# Altium footprint library PowerProducts.PCBLIB: 166 footprints (part 11 of 11)
Each footprint in its own frame and in the unit in brackets; x right, y up, seen from the top. Pads: shape width x height; smd on the part's side, far side on the other; paste and mask are expansions set on the pad; w line width, h text height; cw(c..) or ccw(c..) is an arc to the next point about the centre after c.
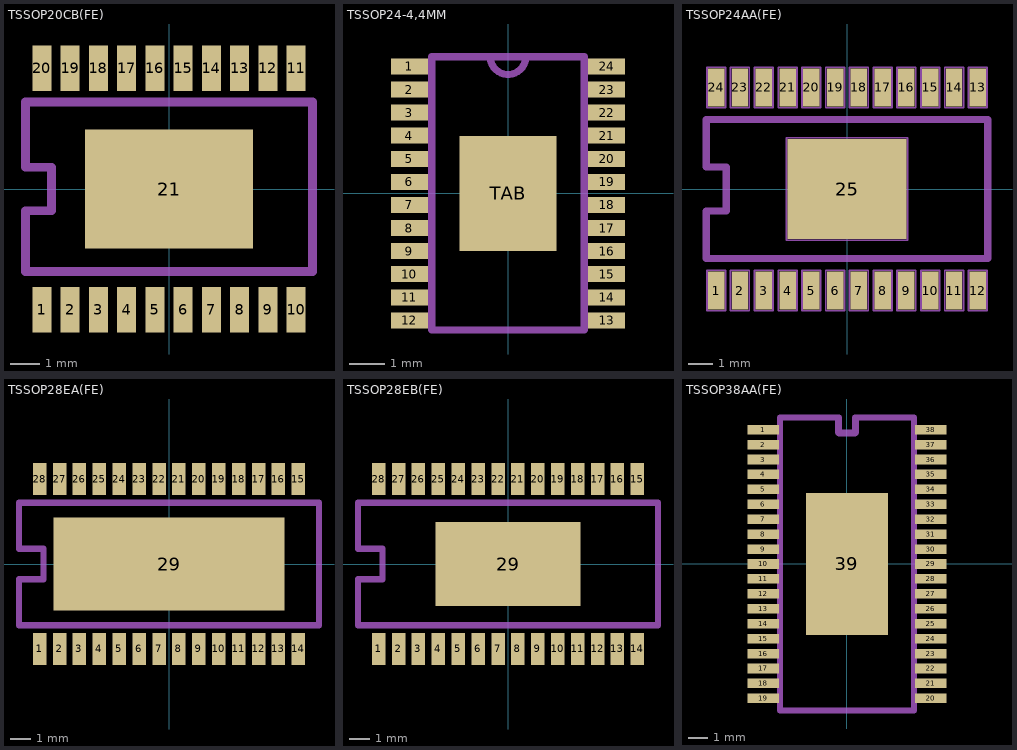
[diagram p10: the footprints below, top view; thin cyan lines are the x and y axes]

## TSSOP20CB(FE) [mil]
pads (21):
  rect 25.98x62.01 smd: 1(-172.74,-163.88) 2(-134.35,-163.88) 3(-95.96,-163.88) 4(-57.58,-163.88) 5(-19.19,-163.88) 6(19.19,-163.88) 7(57.58,-163.88) 8(95.96,-163.88) 9(134.35,-163.88) 10(172.74,-163.88) 11(172.74,163.88) 12(134.35,163.88) 13(95.96,163.88) 14(57.58,163.88) 15(19.19,163.88) 16(-19.19,163.88) 17(-57.58,163.88) 18(-95.96,163.88) 19(-134.35,163.88) 20(-172.74,163.88)
  rect 227.95x161.81 smd: 21(0,0)
Mechanical 2:
  lines w12: -194.88,-112.2 194.88,-112.2 194.88,118.11 -194.88,118.11 -194.88,29.53 -159.45,29.53 -159.45,-29.53 -194.88,-29.53 -194.88,-112.2

## TSSOP24-4,4MM [mil]
pads (25):
  rect 41.34x17.72 smd: 1(-109.25,140.75) 2(-109.25,115.16) 3(-109.25,89.57) 4(-109.25,63.98) 5(-109.25,38.39) 6(-109.25,12.8) 7(-109.25,-12.8) 8(-109.25,-38.39) 9(-109.25,-63.98) 10(-109.25,-89.57) 11(-109.25,-115.16) 12(-109.25,-140.75) 13(109.25,-140.75) 14(109.25,-115.16) 15(109.25,-89.57) 16(109.25,-63.98) 17(109.25,-38.39) 18(109.25,-12.8) 19(109.25,12.8) 20(109.25,38.39) 21(109.25,63.98) 22(109.25,89.57) 23(109.25,115.16) 24(109.25,140.75)
  rect 107.87x127.56 smd: TAB(0,0)
Mechanical 2:
  lines w8: -19.69,151.51 ccw(c0,151.51) 19.69,151.51 ; -84.58,-151.51 84.58,-151.51 84.58,151.51 -84.58,151.51 -84.58,-151.51
Mechanical 18:
  rectangle: -125.98,134.84 -88.58,146.65
  rectangle: -125.98,109.25 -88.58,121.06
  rectangle: -125.98,83.66 -88.58,95.47
  rectangle: -125.98,58.07 -88.58,69.88
  rectangle: -125.98,32.48 -88.58,44.29
  rectangle: -125.98,6.89 -88.58,18.7
  rectangle: -125.98,-18.7 -88.58,-6.89
  rectangle: -125.98,-44.29 -88.58,-32.48
  rectangle: -125.98,-69.88 -88.58,-58.07
  rectangle: -125.98,-95.47 -88.58,-83.66
  rectangle: -125.98,-121.06 -88.58,-109.25
  rectangle: -125.98,-146.65 -88.58,-134.84
  rectangle: 88.58,-146.65 125.98,-134.84
  rectangle: 88.58,-121.06 125.98,-109.25
  rectangle: 88.58,-95.47 125.98,-83.66
  rectangle: 88.58,-69.88 125.98,-58.07
  rectangle: 88.58,-44.29 125.98,-32.48
  rectangle: 88.58,-18.7 125.98,-6.89
  rectangle: 88.58,6.89 125.98,18.7
  rectangle: 88.58,32.48 125.98,44.29
  rectangle: 88.58,58.07 125.98,69.88
  rectangle: 88.58,83.66 125.98,95.47
  rectangle: 88.58,109.25 125.98,121.06
  rectangle: 88.58,134.84 125.98,146.65

## TSSOP24AA(FE) [mil]
pads (25):
  rect 26.57x62.01 smd: 1(-211.12,-163.88) 2(-172.74,-163.88) 3(-134.35,-163.88) 4(-95.96,-163.88) 5(-57.58,-163.88) 6(-19.19,-163.88) 7(19.19,-163.88) 8(57.58,-163.88) 9(95.96,-163.88) 10(134.35,-163.88) 11(172.74,-163.88) 12(211.12,-163.88) 13(211.12,163.88) 14(172.74,163.88) 15(134.35,163.88) 16(95.96,163.88) 17(57.58,163.88) 18(19.19,163.88) 19(-19.19,163.88) 20(-57.58,163.88) 21(-95.96,163.88) 22(-134.35,163.88) 23(-172.74,163.88) 24(-211.12,163.88)
  rect 191.93x161.81 smd: 25(0,0)
Mechanical 2:
  lines w2.95: -226.18,-196.65 -226.18,-131.1 -196.06,-131.1 -196.06,-196.65 -226.18,-196.65 ; -226.18,131.1 -226.18,196.65 -196.06,196.65 -196.06,131.1 -226.18,131.1 ; -187.8,-196.65 -187.8,-131.1 -157.68,-131.1 -157.68,-196.65 -187.8,-196.65 ; -187.8,131.1 -187.8,196.65 -157.68,196.65 -157.68,131.1 -187.8,131.1 ; -149.41,-196.65 -149.41,-131.1 -119.29,-131.1 -119.29,-196.65 -149.41,-196.65 ; -149.41,131.1 -149.41,196.65 -119.29,196.65 -119.29,131.1 -149.41,131.1 ; -111.02,-196.65 -111.02,-131.1 -80.91,-131.1 -80.91,-196.65 -111.02,-196.65 ; -111.02,131.1 -111.02,196.65 -80.91,196.65 -80.91,131.1 -111.02,131.1 ; -97.74,-82.68 97.74,-82.68 97.74,82.68 -97.74,82.68 -97.74,-82.68 ; -72.64,-196.65 -72.64,-131.1 -42.52,-131.1 -42.52,-196.65 -72.64,-196.65 ; -72.64,131.1 -72.64,196.65 -42.52,196.65 -42.52,131.1 -72.64,131.1 ; -34.25,-196.65 -34.25,-131.1 -4.13,-131.1 -4.13,-196.65 -34.25,-196.65 ; -34.25,131.1 -34.25,196.65 -4.13,196.65 -4.13,131.1 -34.25,131.1 ; 4.13,-196.65 4.13,-131.1 34.25,-131.1 34.25,-196.65 4.13,-196.65 ; 4.13,131.1 4.13,196.65 34.25,196.65 34.25,131.1 4.13,131.1 ; 42.52,-196.65 42.52,-131.1 72.64,-131.1 72.64,-196.65 42.52,-196.65 ; 42.52,131.1 42.52,196.65 72.64,196.65 72.64,131.1 42.52,131.1 ; 80.91,-196.65 80.91,-131.1 111.02,-131.1 111.02,-196.65 80.91,-196.65 ; 80.91,131.1 80.91,196.65 111.02,196.65 111.02,131.1 80.91,131.1 ; 119.29,-196.65 119.29,-131.1 149.41,-131.1 149.41,-196.65 119.29,-196.65 ; 119.29,131.1 119.29,196.65 149.41,196.65 149.41,131.1 119.29,131.1 ; 157.68,-196.65 157.68,-131.1 187.8,-131.1 187.8,-196.65 157.68,-196.65 ; 157.68,131.1 157.68,196.65 187.8,196.65 187.8,131.1 157.68,131.1 ; 196.06,-196.65 196.06,-131.1 226.18,-131.1 226.18,-196.65 196.06,-196.65 ; 196.06,131.1 196.06,196.65 226.18,196.65 226.18,131.1 196.06,131.1
  lines w11.81: -227.36,-112.2 227.36,-112.2 227.36,112.2 -227.36,112.2 -227.36,35.43 -194.88,35.43 -194.88,-35.43 -227.36,-35.43 -227.36,-112.2

## TSSOP28EA(FE) [mil]
pads (29):
  rect 25.98x62.01 smd: 1(-249.51,-163.88) 2(-211.12,-163.88) 3(-172.74,-163.88) 4(-134.35,-163.88) 5(-95.96,-163.88) 6(-57.58,-163.88) 7(-19.19,-163.88) 8(19.19,-163.88) 9(57.58,-163.88) 10(95.96,-163.88) 11(134.35,-163.88) 12(172.74,-163.88) 13(211.12,-163.88) 14(249.51,-163.88) 15(249.51,163.88) 16(211.12,163.88) 17(172.74,163.88) 18(134.35,163.88) 19(95.96,163.88) 20(57.58,163.88) 21(19.19,163.88) 22(-19.19,163.88) 23(-57.58,163.88) 24(-95.96,163.88) 25(-134.35,163.88) 26(-172.74,163.88) 27(-211.12,163.88) 28(-249.51,163.88)
  rect 446.46x180.12 smd: 29(0,0)
Mechanical 2:
  lines w12: -289.37,-118.11 289.37,-118.11 289.37,118.11 -289.37,118.11 -289.37,29.53 -242.13,29.53 -242.13,-29.53 -289.37,-29.53 -289.37,-118.11

## TSSOP28EB(FE) [mil]
pads (29):
  rect 25.98x62.01 smd: 1(-249.51,-163.88) 2(-211.12,-163.88) 3(-172.74,-163.88) 4(-134.35,-163.88) 5(-95.96,-163.88) 6(-57.58,-163.88) 7(-19.19,-163.88) 8(19.19,-163.88) 9(57.58,-163.88) 10(95.96,-163.88) 11(134.35,-163.88) 12(172.74,-163.88) 13(211.12,-163.88) 14(249.51,-163.88) 15(249.51,163.88) 16(211.12,163.88) 17(172.74,163.88) 18(134.35,163.88) 19(95.96,163.88) 20(57.58,163.88) 21(19.19,163.88) 22(-19.19,163.88) 23(-57.58,163.88) 24(-95.96,163.88) 25(-134.35,163.88) 26(-172.74,163.88) 27(-211.12,163.88) 28(-249.51,163.88)
  rect 280.51x161.81 smd: 29(0,0)
Mechanical 2:
  lines w12: -289.37,-118.11 289.37,-118.11 289.37,118.11 -289.37,118.11 -289.37,29.53 -242.13,29.53 -242.13,-29.53 -289.37,-29.53 -289.37,-118.11

## TSSOP38AA(FE) [mm]
pads (39):
  rect 1.575x0.48 smd: 1(-4.2,6.75) 2(-4.2,6) 3(-4.2,5.25) 4(-4.2,4.5) 5(-4.2,3.75) 6(-4.2,3) 7(-4.2,2.25) 8(-4.2,1.5) 9(-4.2,0.75) 10(-4.2,0) 11(-4.2,-0.75) 12(-4.2,-1.5) 13(-4.2,-2.25) 14(-4.2,-3) 15(-4.2,-3.75) 16(-4.2,-4.5) 17(-4.2,-5.25) 18(-4.2,-6) 19(-4.2,-6.75) 20(4.2,-6.75) 21(4.2,-6) 22(4.2,-5.25) 23(4.2,-4.5) 24(4.2,-3.75) 25(4.2,-3) 26(4.2,-2.25) 27(4.2,-1.5) 28(4.2,-0.75) 29(4.2,0) 30(4.2,0.75) 31(4.2,1.5) 32(4.2,2.25) 33(4.2,3) 34(4.2,3.75) 35(4.2,4.5) 36(4.2,5.25) 37(4.2,6) 38(4.2,6.75)
  rect 4.11x7.125 smd: 39(0,0)
Mechanical 2:
  lines w0.3: -0.45,7.35 -0.394,7.35 -0.394,6.563 0.394,6.563 0.394,7.35 0.45,7.35 ; -0.45,7.35 -3.375,7.35 -3.375,-7.125 -3.375,-7.35 3.375,-7.35 3.375,7.35 0.45,7.35 ; -0.45,7.35 -0.45,6.6 0.45,6.6 0.45,7.35